# Altium footprint library NDLib.PCBLIB: 499 footprints (part 26 of 32)
Each footprint in its own frame and in the unit in brackets; x right, y up, seen from the top. Pads: shape width x height; smd on the part's side, far side on the other; paste and mask are expansions set on the pad; w line width, h text height; cw(c..) or ccw(c..) is an arc to the next point about the centre after c.
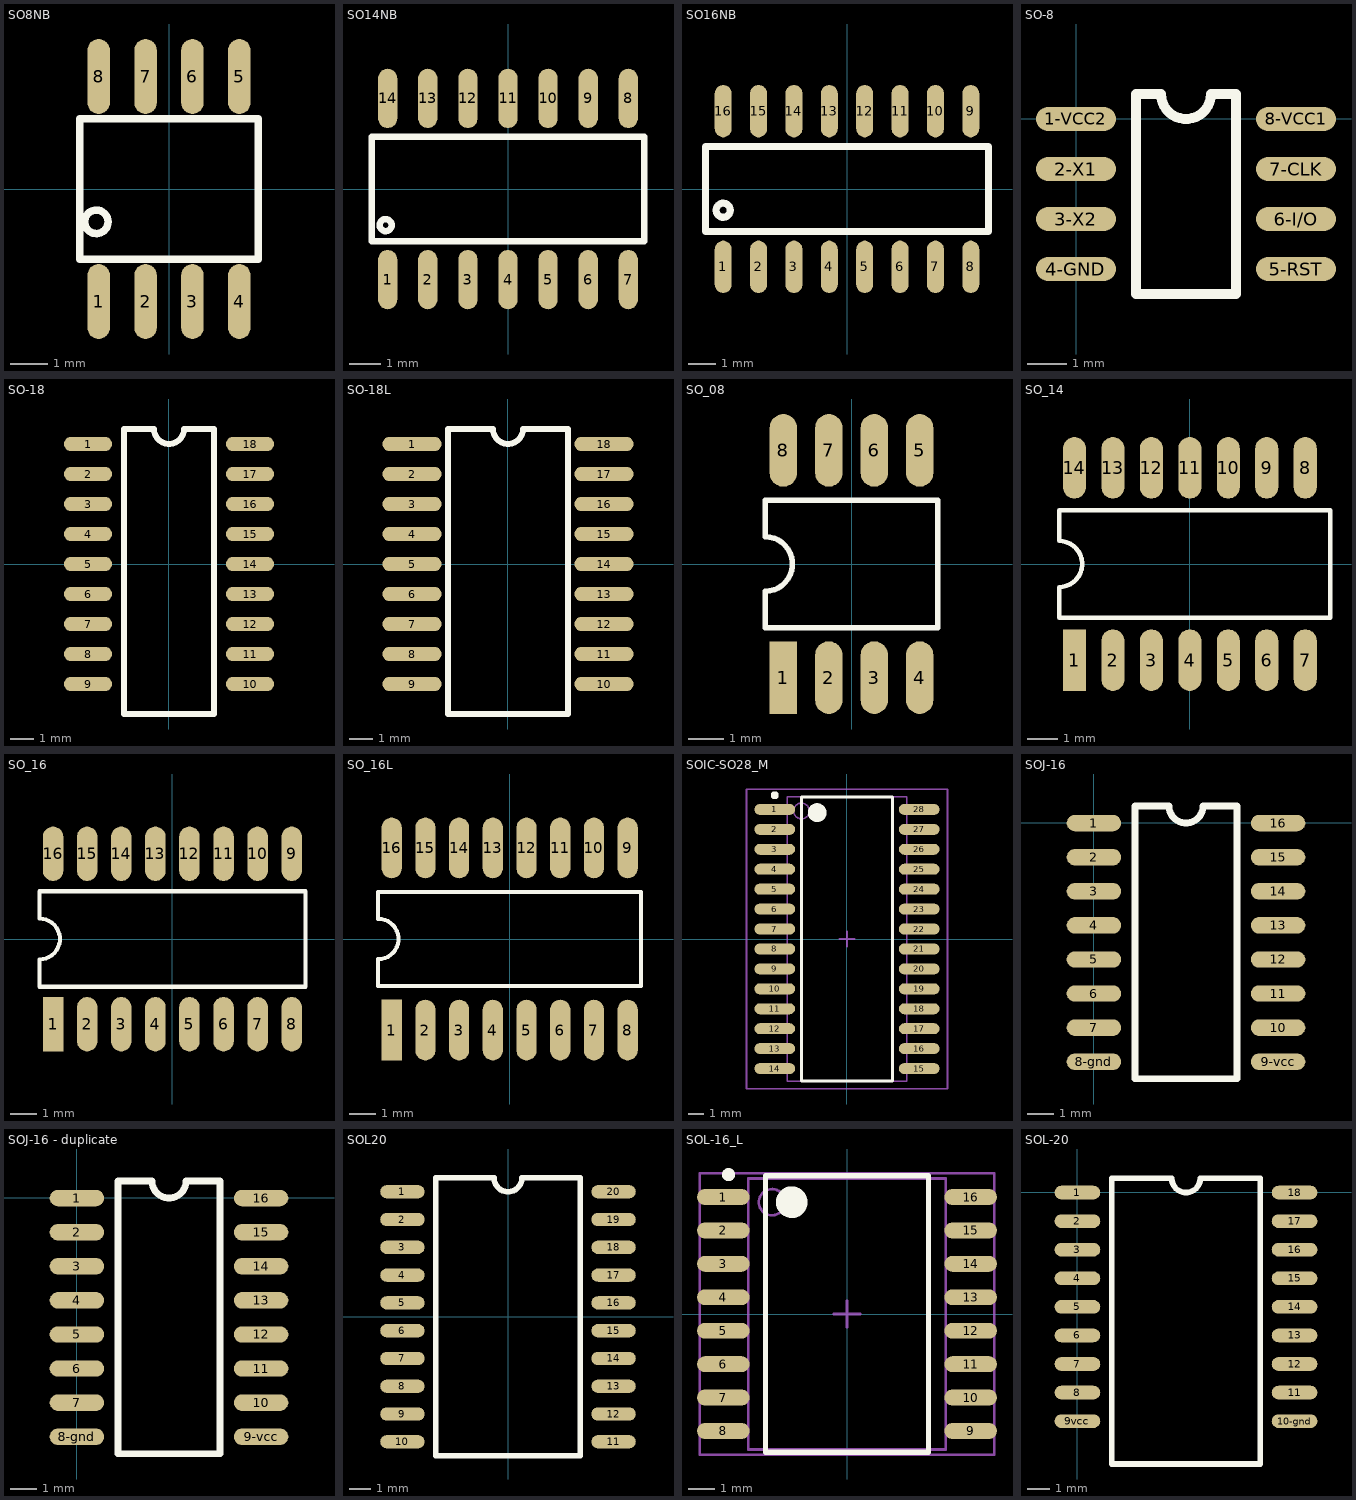
[diagram p25: the footprints below, top view; thin cyan lines are the x and y axes]

## SO8NB [mil]
pads (8):
  oval 24x80 smd: 1(-75,-120) 2(-25,-120) 3(25,-120) 4(75,-120) 5(75,120) 6(25,120) 7(-25,120) 8(-75,120)
TopOverlay:
  circle w8: c-77.5,-35 r12.5
  lines w8: -95,-75 -95,75 95,75 95,-75 -95,-75
3D body: height 61.02, standoff -1.97, extent -96.91,-117.91 96,117.91

## SO14NB [mil]
pads (14):
  oval 24x74 smd: 1(-150,-113) 2(-100,-113) 3(-50,-113) 4(0,-113) 5(50,-113) 6(100,-113) 7(150,-113) 8(150,113) 9(100,113) 10(50,113) 11(0,113) 12(-50,113) 13(-100,113) 14(-150,113)
TopOverlay:
  circle w8: c-152.5,-45 r7.5
  lines w8: -170,-65 -170,65 170,65 170,-65 -170,-65
3D body: height 61.02, standoff -1.97, extent -171.06,-117.83 171.06,118

## SO16NB [mil]
pads (16):
  oval 24x74 smd: 1(-175,-110) 2(-125,-110) 3(-75,-110) 4(-25,-110) 5(25,-110) 6(75,-110) 7(125,-110) 8(175,-110) 9(175,110) 10(125,110) 11(75,110) 12(25,110) 13(-25,110) 14(-75,110) 15(-125,110) 16(-175,110)
TopOverlay:
  circle w10: c-175,-30 r10
  lines w10: -200,-60 -200,60 200,60 200,-60 -200,-60
3D body: height 68.9, standoff 0, extent -193.83,-115 192,113.35

## SO-8 [mil]
pads (8):
  oval 80x24 smd: 1-VCC2(-0.48,-0.49) 2-X1(-0.48,-50.49) 3-X2(-0.48,-100.49) 4-GND(-0.48,-150.49) 5-RST(219.52,-150.49) 6-I/O(219.52,-100.49) 7-CLK(219.52,-50.49) 8-VCC1(219.52,-0.49)
TopOverlay:
  lines w10: 59.52,-175.49 159.52,-175.49 159.52,24.51 134.52,24.51 cw(c109.52,24.51) 84.52,24.51 59.52,24.51 59.52,-175.49
3D body: height 61.02, standoff -1.97, extent 1.61,-171.49 237.43,21.42

## SO-18 [mil]
pads (18):
  oval 80x24 smd: 1(-135,200) 2(-135,150) 3(-135,100) 4(-135,50) 5(-135,0) 6(-135,-50) 7(-135,-100) 8(-135,-150) 9(-135,-200) 10(135,-200) 11(135,-150) 12(135,-100) 13(135,-50) 14(135,0) 15(135,50) 16(135,100) 17(135,150) 18(135,200)
TopOverlay:
  lines w10: -75,-250 -75,225 -25,225 ccw(c0,225) 25,225 75,225 75,-250 -75,-250

## SO-18L [mil]
pads (18):
  oval 98.43x24 smd: 1(-160,200) 2(-160,150) 3(-160,100) 4(-160,50) 5(-160,0) 6(-160,-50) 7(-160,-100) 8(-160,-150) 9(-160,-200) 10(160,-200) 11(160,-150) 12(160,-100) 13(160,-50) 14(160,0) 15(160,50) 16(160,100) 17(160,150) 18(160,200)
TopOverlay:
  lines w10: -100,-250 -100,225 -25,225 ccw(c0,225) 25,225 100,225 100,-250 -100,-250

## SO_08 [mil]
pads (8):
  rect 30x80 smd: 1(-75,-125)
  oval 30x80 smd: 2(-25,-125) 3(25,-125) 4(75,-125) 5(75,125) 6(25,125) 7(-25,125) 8(-75,125)
TopOverlay:
  lines w6: -95,-70 -95,-30 ccw(c-95,0) -95,30 -95,70 95,70 95,-70 -95,-70
3D body: height 61.02, standoff -1.97, extent -96.45,-117.91 96.46,117.92

## SO_14 [mil]
pads (14):
  rect 30x80 smd: 1(-150,-125)
  oval 30x80 smd: 2(-100,-125) 3(-50,-125) 4(0,-125) 5(50,-125) 6(100,-125) 7(150,-125) 8(150,125) 9(100,125) 10(50,125) 11(0,125) 12(-50,125) 13(-100,125) 14(-150,125)
TopOverlay:
  lines w6: -170,-70 182.48,-70 182.48,70 -170,70 -170,30 cw(c-170,0) -170,-30 -170,-70

## SO_16 [mil]
pads (16):
  rect 30x80 smd: 1(-175,-125)
  oval 30x80 smd: 2(-125,-125) 3(-75,-125) 4(-25,-125) 5(25,-125) 6(75,-125) 7(125,-125) 8(175,-125) 9(175,125) 10(125,125) 11(75,125) 12(25,125) 13(-25,125) 14(-75,125) 15(-125,125) 16(-175,125)
TopOverlay:
  lines w6: -195,-70 195,-70 195,70 -195,70 -195,30 cw(c-195,0) -195,-30 -195,-70
3D body: height 68.9, standoff 0, extent -193.83,-115 192,113.35

## SO_16L [mil]
pads (16):
  rect 30x90 smd: 1(-175,-135)
  oval 30x90 smd: 2(-125,-135) 3(-75,-135) 4(-25,-135) 5(25,-135) 6(75,-135) 7(125,-135) 8(175,-135) 9(175,135) 10(125,135) 11(75,135) 12(25,135) 13(-25,135) 14(-75,135) 15(-125,135) 16(-175,135)
TopOverlay:
  lines w6: -195,-70 -195,-30 ccw(c-195,0) -195,30 -195,70 195,70 195,-70 -195,-70
3D body: height 68.9, standoff 0, extent -193.83,-115 192,113.35

## SOIC-SO28_M [mm] "SOIC, 28-Leads, Body 17.9x7.5mm, Pitch 1.27mm, IPC Low Density"
height 2.65
pads (28):
  oval 2.6x0.7 smd: 1(-4.6,8.255) 2(-4.6,6.985) 3(-4.6,5.715) 4(-4.6,4.445) 5(-4.6,3.175) 6(-4.6,1.905) 7(-4.6,0.635) 8(-4.6,-0.635) 9(-4.6,-1.905) 10(-4.6,-3.175) 11(-4.6,-4.445) 12(-4.6,-5.715) 13(-4.6,-6.985) 14(-4.6,-8.255) 15(4.6,-8.255) 16(4.6,-6.985) 17(4.6,-5.715) 18(4.6,-4.445) 19(4.6,-3.175) 20(4.6,-1.905) 21(4.6,-0.635) 22(4.6,0.635) 23(4.6,1.905) 24(4.6,3.175) 25(4.6,4.445) 26(4.6,5.715) 27(4.6,6.985) 28(4.6,8.255)
TopOverlay:
  circle w0.25: c-4.6,9.155 r0.125
  circle w0.6: c-1.9,8.05 r0.3
  lines w0.2: -2.9,-9.05 -2.9,9.05 2.9,9.05 2.9,-9.05 -2.9,-9.05
Mechanical13:
  circle w0.1: c-2.9,8.155 r0.5
  lines w0.1: -3.8,-9.055 -3.8,9.055 3.8,9.055 3.8,-9.055 -3.8,-9.055
Mechanical15:
  lines w0.1: -0.5,0 0.5,0 ; 0,-0.5 0,0.5 ; -6.4,-9.55 -6.4,9.55 6.4,9.55 6.4,-9.55 -6.4,-9.55
3D body: height 2.63, standoff -0.01, extent -5.335,-9.038 5.335,9.042

## SOJ-16 [mil]
pads (16):
  oval 80x24 smd: 1(0.48,-0.39) 2(0.48,-50.39) 3(0.48,-100.39) 4(0.48,-150.39) 5(0.48,-200.39) 6(0.48,-250.39) 7(0.48,-300.39) 8-gnd(0.48,-350.39) 9-vcc(270.48,-350.39) 10(270.48,-300.39) 11(270.48,-250.39) 12(270.48,-200.39) 13(270.48,-150.39) 14(270.48,-100.39) 15(270.48,-50.39) 16(270.48,-0.39)
TopOverlay:
  lines w10: 60.48,-375.39 210.48,-375.39 210.48,24.61 160.48,24.61 cw(c135.48,24.61) 110.48,24.61 60.48,24.61 60.48,-375.39
3D body: height 68.9, standoff 0, extent 20.48,-367.39 248.83,18.44

## SOJ-16 - duplicate [mil]
pads (16):
  oval 80x24 smd: 1(0.48,-0.39) 2(0.48,-50.39) 3(0.48,-100.39) 4(0.48,-150.39) 5(0.48,-200.39) 6(0.48,-250.39) 7(0.48,-300.39) 8-gnd(0.48,-350.39) 9-vcc(270.48,-350.39) 10(270.48,-300.39) 11(270.48,-250.39) 12(270.48,-200.39) 13(270.48,-150.39) 14(270.48,-100.39) 15(270.48,-50.39) 16(270.48,-0.39)
TopOverlay:
  lines w10: 60.48,-375.39 210.48,-375.39 210.48,24.61 160.48,24.61 cw(c135.48,24.61) 110.48,24.61 60.48,24.61 60.48,-375.39
3D body: height 68.9, standoff 0, extent 20.48,-367.39 248.83,18.44

## SOL20 [mil]
pads (20):
  oval 80x24 smd: 1(-190,225) 2(-190,175) 3(-190,125) 4(-190,75) 5(-190,25) 6(-190,-25) 7(-190,-75) 8(-190,-125) 9(-190,-175) 10(-190,-225) 11(190,-225) 12(190,-175) 13(190,-125) 14(190,-75) 15(190,-25) 16(190,25) 17(190,75) 18(190,125) 19(190,175) 20(190,225)
TopOverlay:
  lines w10: -130,-250 130,-250 130,250 25,250 cw(c0,250) -25,250 -130,250 -130,-250

## SOL-16_L [mm] "16-Pin Small Outline Integrated Circuit 1.27 mm Pitch, IPC High Density"
height 2.65
pads (16):
  oval 2x0.6 smd: 1(-4.7,4.445) 2(-4.7,3.175) 3(-4.7,1.905) 4(-4.7,0.635) 5(-4.7,-0.635) 6(-4.7,-1.905) 7(-4.7,-3.175) 8(-4.7,-4.445) 9(4.7,-4.445) 10(4.7,-3.175) 11(4.7,-1.905) 12(4.7,-0.635) 13(4.7,0.635) 14(4.7,1.905) 15(4.7,3.175) 16(4.7,4.445)
TopOverlay:
  circle w0.25: c-4.5,5.295 r0.125
  circle w0.6: c-2.1,4.25 r0.3
  lines w0.2: -3.1,-5.25 -3.1,5.25 3.1,5.25 3.1,-5.25 -3.1,-5.25
Mechanical13:
  circle w0.1: c-2.85,4.25 r0.5
  lines w0.1: -3.75,-5.15 -3.75,5.15 3.75,5.15 3.75,-5.15 -3.75,-5.15
Mechanical15:
  lines w0.1: -0.5,0 0.5,0 ; 0,-0.5 0,0.5 ; -5.6,-5.35 -5.6,5.35 5.6,5.35 5.6,-5.35 -5.6,-5.35
3D body: height 2.65, standoff 0, extent -5.182,-5.144 5.118,5.156

## SOL-20 [mil]
pads (18):
  oval 80x24 smd: 1(0.34,-0.46) 2(0.34,-50.46) 3(0.34,-100.46) 4(0.34,-150.46) 5(0.34,-200.46) 6(0.34,-250.46) 7(0.34,-300.46) 8(0.34,-350.46) 9vcc(0.34,-400.46) 10-gnd(380.34,-400.46) 11(380.34,-350.46) 12(380.34,-300.46) 13(380.34,-250.46) 14(380.34,-200.46) 15(380.34,-150.46) 16(380.34,-100.46) 17(380.34,-50.46) 18(380.34,-0.46)
TopOverlay:
  lines w10: 60.34,-475.46 60.34,24.54 165.34,24.54 ccw(c190.34,24.54) 215.34,24.54 320.34,24.54 320.34,-475.46 60.34,-475.46